# Altium footprint library KEY_PLC1.PcbLib: 123 footprints (part 3 of 8)
Each footprint in its own frame and in the unit in brackets; x right, y up, seen from the top. Pads: shape width x height; smd on the part's side, far side on the other; paste and mask are expansions set on the pad; w line width, h text height; cw(c..) or ccw(c..) is an arc to the next point about the centre after c.
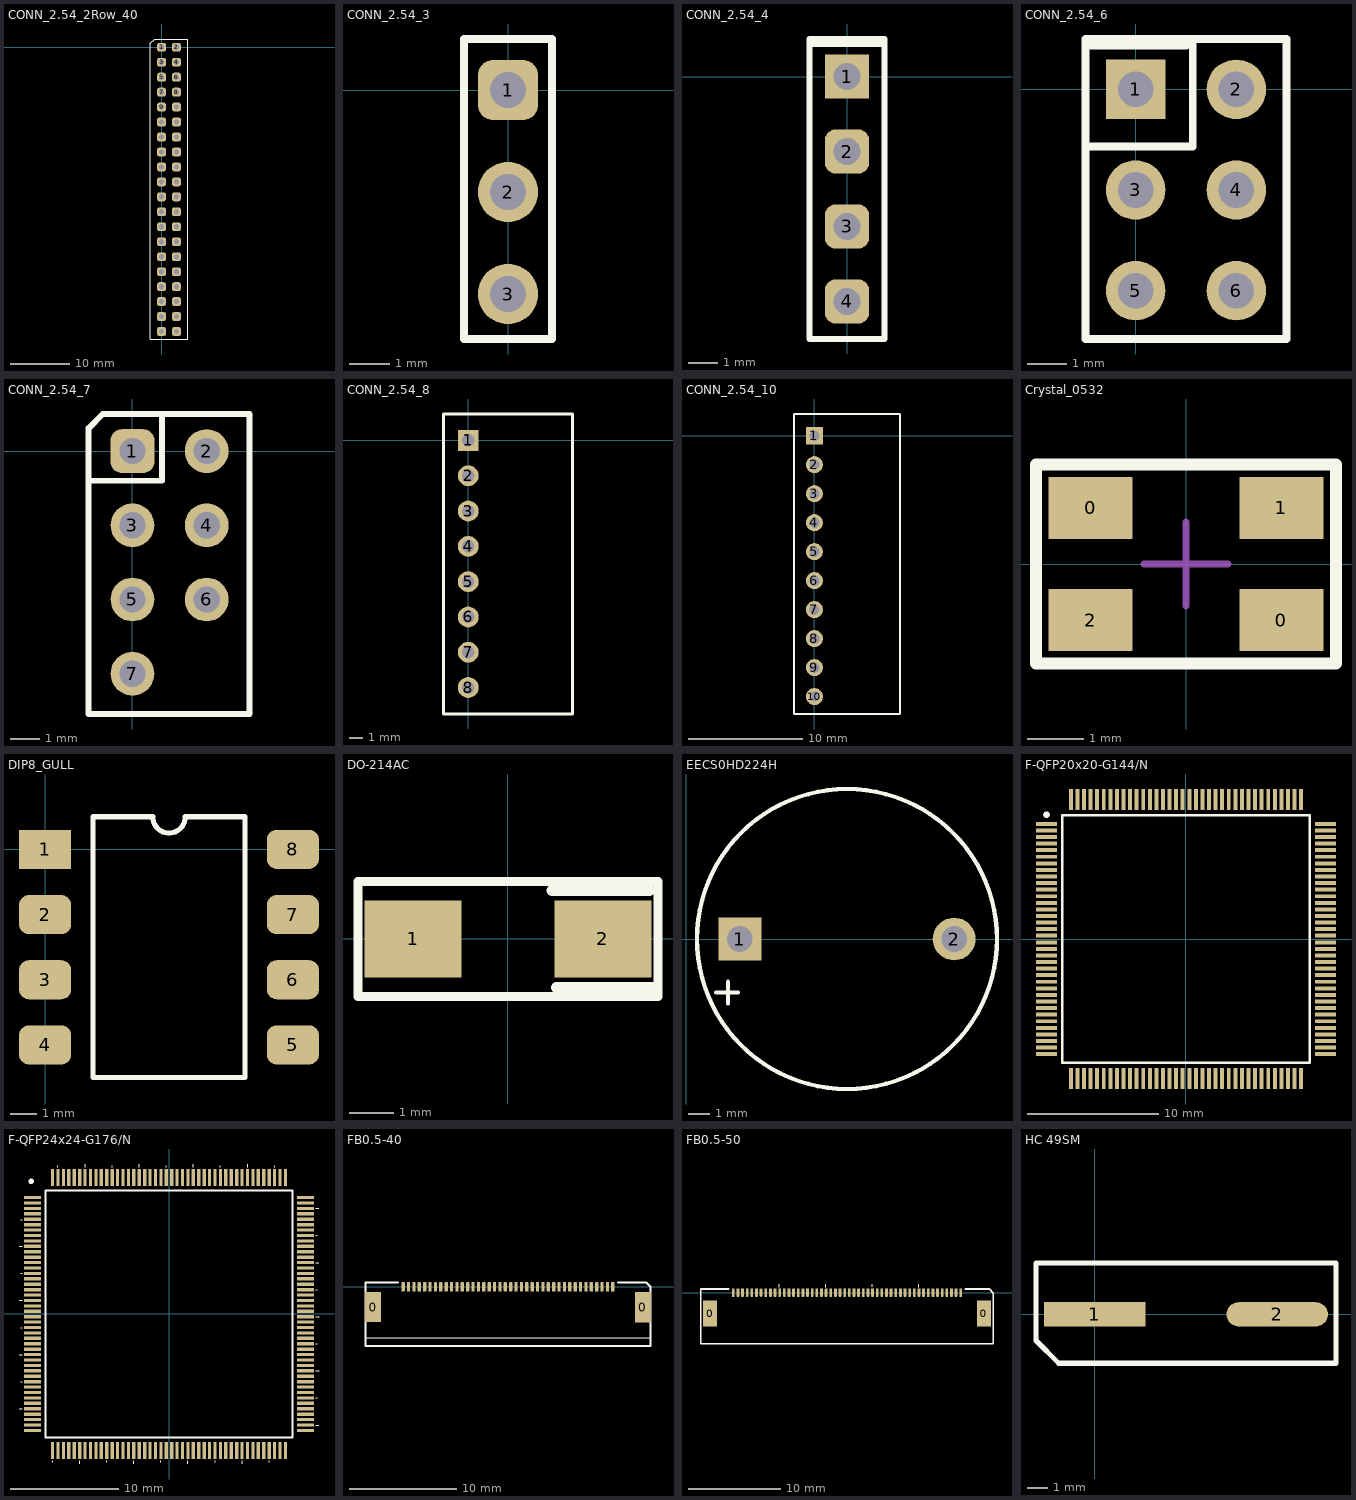
[diagram p2: the footprints below, top view; thin cyan lines are the x and y axes]

## CONN_2.54_2Row_40 [mm]
pads (40):
  rrect50% 1.5x1.5 hole 0.9: 1(0,0) 2(2.54,0) 3(0,-2.54) 4(2.54,-2.54) 5(0,-5.08) 6(2.54,-5.08) 7(0,-7.62) 8(2.54,-7.62) 9(0,-10.16) 10(2.54,-10.16) 11(0,-12.7) 12(2.54,-12.7) 13(0,-15.24) 14(2.54,-15.24) 15(0,-17.78) 16(2.54,-17.78) 17(0,-20.32) 18(2.54,-20.32) 19(0,-22.86) 20(2.54,-22.86) 21(0,-25.4) 22(2.54,-25.4) 23(0,-27.94) 24(2.54,-27.94) 25(0,-30.48) 26(2.54,-30.48) 27(0,-33.02) 28(2.54,-33.02) 29(0,-35.56) 30(2.54,-35.56) 31(0,-38.1) 32(2.54,-38.1) 33(0,-40.64) 34(2.54,-40.64) 35(0,-43.18) 36(2.54,-43.18) 37(0,-45.72) 38(2.54,-45.72) 39(0,-48.26) 40(2.54,-48.26)
Top Overlay:
  lines w0.2: -1.905,-49.53 -1.905,0.635 -1.143,1.397 4.445,1.397 4.445,-8.89 4.445,-49.53 1.27,-49.53 -1.905,-49.53

## CONN_2.54_3 [mm]
pads (3):
  rrect50% 1.5x1.5 hole 0.9: 1(0,0)
  round 1.5 hole 0.9: 2(0,-2.54) 3(0,-5.08)
Top Overlay:
  lines w0.2: -1.1,-6.2 1.1,-6.2 1.1,1.27 -1.1,1.27 -1.1,-6.2

## CONN_2.54_4 [mm]
pads (4):
  rect 1.5x1.5 hole 0.9: 1(0,0)
  rrect50% 1.5x1.5 hole 0.9: 2(0,-2.54) 3(0,-5.08) 4(0,-7.62)
Top Overlay:
  lines w0.2: -1.27,1.1 1.27,1.1 ; -1.27,-8.89 1.27,-8.89 1.27,1.27 -1.27,1.27 -1.27,-8.89

## CONN_2.54_6 [mm]
pads (6):
  rect 1.5x1.5 hole 0.9: 1(0,0)
  round 1.5 hole 0.9: 2(2.54,0) 3(0,-2.54) 4(2.54,-2.54) 5(0,-5.08) 6(2.54,-5.08)
Top Overlay:
  lines w0.2: -1.27,-1.44 1.44,-1.44 1.44,1.27 ; -1.27,1.1 1.27,1.1 ; -1.27,-6.3 3.81,-6.3 3.81,1.27 -1.27,1.27 -1.27,-6.3

## CONN_2.54_7 [mm]
pads (7):
  rrect50% 1.5x1.5 hole 0.9: 1(0,0)
  round 1.5 hole 0.9: 2(2.54,0) 3(0,-2.54) 4(2.54,-2.54) 5(0,-5.08) 6(2.54,-5.08) 7(0,-7.62)
Top Overlay:
  lines w0.2: -1.5,-1.016 1.016,-1.016 1.016,1.27 ; -1.5,-9 -1.5,0.786 -1.016,1.27 4,1.27 4,-9 -1.5,-9

## CONN_2.54_8 [mm]
pads (8):
  rect 1.5x1.5 hole 0.9: 1(0,0)
  round 1.5 hole 0.9: 2(0,-2.54) 3(0,-5.08) 4(0,-7.62) 5(0,-10.16) 6(0,-12.7) 7(0,-15.24) 8(0,-17.78)
Top Overlay:
  lines w0.2: -1.778,-19.685 -1.778,1.905 7.493,1.905 7.493,-19.685 -1.778,-19.685

## CONN_2.54_10 [mm]
pads (10):
  rect 1.5x1.5 hole 0.9: 1(0,0)
  round 1.5 hole 0.9: 2(0,-2.54) 3(0,-5.08) 4(0,-7.62) 5(0,-10.16) 6(0,-12.7) 7(0,-15.24) 8(0,-17.78) 9(0,-20.32) 10(0,-22.86)
Top Overlay:
  lines w0.2: -1.778,-24.384 7.493,-24.384 7.493,1.905 -1.778,1.905 -1.778,-24.384

## Crystal_0532 [mm]
height 1.5
pads (4):
  rect 1.5x1.1 smd: 0(-1.7,1) 0(1.7,-1) 1(1.7,1) 2(-1.7,-1)
Top Overlay:
  lines w0.22: -2.675,-1.775 2.675,-1.775 2.675,1.775 -2.675,1.775 -2.675,-1.775
Mechanical 13:
  lines w0.127: -0.75,0 0,0 ; 0,-0.75 0,0 ; 0,0.75 0,0 ; 0.75,0 0,0 ; -2.65,-1.75 2.65,-1.75 2.65,1.75 -2.65,1.75 -2.65,-1.75
3D body "CRYSTALSMD5X32.STEP": height 1, standoff 0, extent -2.5,-1.6 2.5,1.6

## DIP8_GULL [mm]
pads (8):
  rect 2x1.5 smd: 1(0,0)
  rrect50% 2x1.5 smd: 2(0,-2.5) 3(0,-5) 4(0,-7.5) 5(9.5,-7.5) 6(9.5,-5) 7(9.5,-2.5) 8(9.5,0)
Top Overlay:
  lines w0.2: 1.835,-8.75 1.835,1.25 4.125,1.25 ccw(c4.75,1.25) 5.375,1.25 7.665,1.25 7.665,-8.75 1.835,-8.75
3D body "User Library-8-pin-DIP_GW_HCPL-4200-300E.step": height 4.3, standoff -0.03, extent -0.225,-8.675 9.675,1.225

## DO-214AC [mm]
pads (2):
  rect 2.2x1.75 smd: 1(-2.15,0) 2(2.15,0)
Top Overlay:
  lines w0.2: -3.4,-1.3 3.4,-1.3 3.4,-0.75 3.4,0.35 3.4,1.3 -3.4,1.3 -3.4,-1.3
  lines w0.254: 1,1.1 3.2,1.1 ; 1.1,-1.1 3.3,-1.1
3D body "User Library-DO-214AC_SMA.step": height 2.2, standoff 0, extent -2.5,-1.35 2.5,1.35

## EECS0HD224H [mm]
height 8
pads (2):
  rect 2x2 hole 1.2: 1(2.5,0)
  round 2 hole 1.2: 2(12.5,0)
Top Overlay:
  circle w0.2: c7.5,0 r7
  lines w0.2: 1.4,-2.5 2.416,-2.5 ; 1.95,-3.008 1.95,-1.992
3D body "iONISTER.stp": height 5.78, standoff 0, extent 2.576,-5 12.424,5

## F-QFP20x20-G144/N [mm] "144-Pin Plastic Quad Flat Pack (TQFP)"
height 1.6
pads (144):
  rect 1.6x0.3 smd: 1(-10.6,8.75) 2(-10.6,8.25) 3(-10.6,7.75) 4(-10.6,7.25) 5(-10.6,6.75) 6(-10.6,6.25) 7(-10.6,5.75) 8(-10.6,5.25) 9(-10.6,4.75) 10(-10.6,4.25) 11(-10.6,3.75) 12(-10.6,3.25) 13(-10.6,2.75) 14(-10.6,2.25) 15(-10.6,1.75) 16(-10.6,1.25) 17(-10.6,0.75) 18(-10.6,0.25) 19(-10.6,-0.25) 20(-10.6,-0.75) 21(-10.6,-1.25) 22(-10.6,-1.75) 23(-10.6,-2.25) 24(-10.6,-2.75) 25(-10.6,-3.25) 26(-10.6,-3.75) 27(-10.6,-4.25) 28(-10.6,-4.75) 29(-10.6,-5.25) 30(-10.6,-5.75) 31(-10.6,-6.25) 32(-10.6,-6.75) 33(-10.6,-7.25) 34(-10.6,-7.75) 35(-10.6,-8.25) 36(-10.6,-8.75) 73(10.6,-8.75) 74(10.6,-8.25) 75(10.6,-7.75) 76(10.6,-7.25) 77(10.6,-6.75) 78(10.6,-6.25) 79(10.6,-5.75) 80(10.6,-5.25) 81(10.6,-4.75) 82(10.6,-4.25) 83(10.6,-3.75) 84(10.6,-3.25) 85(10.6,-2.75) 86(10.6,-2.25) 87(10.6,-1.75) 88(10.6,-1.25) 89(10.6,-0.75) 90(10.6,-0.25) 91(10.6,0.25) 92(10.6,0.75) 93(10.6,1.25) 94(10.6,1.75) 95(10.6,2.25) 96(10.6,2.75) 97(10.6,3.25) 98(10.6,3.75) 99(10.6,4.25) 100(10.6,4.75) 101(10.6,5.25) 102(10.6,5.75) 103(10.6,6.25) 104(10.6,6.75) 105(10.6,7.25) 106(10.6,7.75) 107(10.6,8.25) 108(10.6,8.75)
  rect 0.3x1.6 smd: 37(-8.75,-10.6) 38(-8.25,-10.6) 39(-7.75,-10.6) 40(-7.25,-10.6) 41(-6.75,-10.6) 42(-6.25,-10.6) 43(-5.75,-10.6) 44(-5.25,-10.6) 45(-4.75,-10.6) 46(-4.25,-10.6) 47(-3.75,-10.6) 48(-3.25,-10.6) 49(-2.75,-10.6) 50(-2.25,-10.6) 51(-1.75,-10.6) 52(-1.25,-10.6) 53(-0.75,-10.6) 54(-0.25,-10.6) 55(0.25,-10.6) 56(0.75,-10.6) 57(1.25,-10.6) 58(1.75,-10.6) 59(2.25,-10.6) 60(2.75,-10.6) 61(3.25,-10.6) 62(3.75,-10.6) 63(4.25,-10.6) 64(4.75,-10.6) 65(5.25,-10.6) 66(5.75,-10.6) 67(6.25,-10.6) 68(6.75,-10.6) 69(7.25,-10.6) 70(7.75,-10.6) 71(8.25,-10.6) 72(8.75,-10.6) 109(8.75,10.6) 110(8.25,10.6) 111(7.75,10.6) 112(7.25,10.6) 113(6.75,10.6) 114(6.25,10.6) 115(5.75,10.6) 116(5.25,10.6) 117(4.75,10.6) 118(4.25,10.6) 119(3.75,10.6) 120(3.25,10.6) 121(2.75,10.6) 122(2.25,10.6) 123(1.75,10.6) 124(1.25,10.6) 125(0.75,10.6) 126(0.25,10.6) 127(-0.25,10.6) 128(-0.75,10.6) 129(-1.25,10.6) 130(-1.75,10.6) 131(-2.25,10.6) 132(-2.75,10.6) 133(-3.25,10.6) 134(-3.75,10.6) 135(-4.25,10.6) 136(-4.75,10.6) 137(-5.25,10.6) 138(-5.75,10.6) 139(-6.25,10.6) 140(-6.75,10.6) 141(-7.25,10.6) 142(-7.75,10.6) 143(-8.25,10.6) 144(-8.75,10.6)
Top Overlay:
  circle w0.25: c-10.6,9.45 r0.125
  lines w0.2: -9.4,-9.4 9.4,-9.4 9.4,9.4 -9.4,9.4 -9.4,-9.4

## F-QFP24x24-G176/N [mm] "176-Pin Plastic Quad Flat Pack (TQFP)"
height 1.6
pads (176):
  rect 1.6x0.3 smd: 1(-12.6,10.75) 2(-12.6,10.25) 3(-12.6,9.75) 4(-12.6,9.25) 5(-12.6,8.75) 6(-12.6,8.25) 7(-12.6,7.75) 8(-12.6,7.25) 9(-12.6,6.75) 10(-12.6,6.25) 11(-12.6,5.75) 12(-12.6,5.25) 13(-12.6,4.75) 14(-12.6,4.25) 15(-12.6,3.75) 16(-12.6,3.25) 17(-12.6,2.75) 18(-12.6,2.25) 19(-12.6,1.75) 20(-12.6,1.25) 21(-12.6,0.75) 22(-12.6,0.25) 23(-12.6,-0.25) 24(-12.6,-0.75) 25(-12.6,-1.25) 26(-12.6,-1.75) 27(-12.6,-2.25) 28(-12.6,-2.75) 29(-12.6,-3.25) 30(-12.6,-3.75) 31(-12.6,-4.25) 32(-12.6,-4.75) 33(-12.6,-5.25) 34(-12.6,-5.75) 35(-12.6,-6.25) 36(-12.6,-6.75) 37(-12.6,-7.25) 38(-12.6,-7.75) 39(-12.6,-8.25) 40(-12.6,-8.75) 41(-12.6,-9.25) 42(-12.6,-9.75) 43(-12.6,-10.25) 44(-12.6,-10.75) 89(12.6,-10.75) 90(12.6,-10.25) 91(12.6,-9.75) 92(12.6,-9.25) 93(12.6,-8.75) 94(12.6,-8.25) 95(12.6,-7.75) 96(12.6,-7.25) 97(12.6,-6.75) 98(12.6,-6.25) 99(12.6,-5.75) 100(12.6,-5.25) 101(12.6,-4.75) 102(12.6,-4.25) 103(12.6,-3.75) 104(12.6,-3.25) 105(12.6,-2.75) 106(12.6,-2.25) 107(12.6,-1.75) 108(12.6,-1.25) 109(12.6,-0.75) 110(12.6,-0.25) 111(12.6,0.25) 112(12.6,0.75) 113(12.6,1.25) 114(12.6,1.75) 115(12.6,2.25) 116(12.6,2.75) 117(12.6,3.25) 118(12.6,3.75) 119(12.6,4.25) 120(12.6,4.75) 121(12.6,5.25) 122(12.6,5.75) 123(12.6,6.25) 124(12.6,6.75) 125(12.6,7.25) 126(12.6,7.75) 127(12.6,8.25) 128(12.6,8.75) 129(12.6,9.25) 130(12.6,9.75) 131(12.6,10.25) 132(12.6,10.75)
  rect 0.3x1.6 smd: 45(-10.75,-12.6) 46(-10.25,-12.6) 47(-9.75,-12.6) 48(-9.25,-12.6) 49(-8.75,-12.6) 50(-8.25,-12.6) 51(-7.75,-12.6) 52(-7.25,-12.6) 53(-6.75,-12.6) 54(-6.25,-12.6) 55(-5.75,-12.6) 56(-5.25,-12.6) 57(-4.75,-12.6) 58(-4.25,-12.6) 59(-3.75,-12.6) 60(-3.25,-12.6) 61(-2.75,-12.6) 62(-2.25,-12.6) 63(-1.75,-12.6) 64(-1.25,-12.6) 65(-0.75,-12.6) 66(-0.25,-12.6) 67(0.25,-12.6) 68(0.75,-12.6) 69(1.25,-12.6) 70(1.75,-12.6) 71(2.25,-12.6) 72(2.75,-12.6) 73(3.25,-12.6) 74(3.75,-12.6) 75(4.25,-12.6) 76(4.75,-12.6) 77(5.25,-12.6) 78(5.75,-12.6) 79(6.25,-12.6) 80(6.75,-12.6) 81(7.25,-12.6) 82(7.75,-12.6) 83(8.25,-12.6) 84(8.75,-12.6) 85(9.25,-12.6) 86(9.75,-12.6) 87(10.25,-12.6) 88(10.75,-12.6) 133(10.75,12.6) 134(10.25,12.6) 135(9.75,12.6) 136(9.25,12.6) 137(8.75,12.6) 138(8.25,12.6) 139(7.75,12.6) 140(7.25,12.6) 141(6.75,12.6) 142(6.25,12.6) 143(5.75,12.6) 144(5.25,12.6) 145(4.75,12.6) 146(4.25,12.6) 147(3.75,12.6) 148(3.25,12.6) 149(2.75,12.6) 150(2.25,12.6) 151(1.75,12.6) 152(1.25,12.6) 153(0.75,12.6) 154(0.25,12.6) 155(-0.25,12.6) 156(-0.75,12.6) 157(-1.25,12.6) 158(-1.75,12.6) 159(-2.25,12.6) 160(-2.75,12.6) 161(-3.25,12.6) 162(-3.75,12.6) 163(-4.25,12.6) 164(-4.75,12.6) 165(-5.25,12.6) 166(-5.75,12.6) 167(-6.25,12.6) 168(-6.75,12.6) 169(-7.25,12.6) 170(-7.75,12.6) 171(-8.25,12.6) 172(-8.75,12.6) 173(-9.25,12.6) 174(-9.75,12.6) 175(-10.25,12.6) 176(-10.75,12.6)
Top Overlay:
  circle w0.25: c-12.725,12.25 r0.125
  lines w0.1: -13.85,-8.75 -13.55,-8.75 ; -13.85,-3.75 -13.55,-3.75 ; -13.85,1.25 -13.55,1.25 ; -13.85,6.25 -13.55,6.25 ; -13.7,-6.25 -13.55,-6.25 ; -13.7,-1.25 -13.55,-1.25 ; -13.7,3.75 -13.55,3.75 ; -13.7,8.725 -13.55,8.725 ; -10.75,-13.7 -10.75,-13.55 ; -10.25,13.55 -10.25,13.7 ; -8.25,-13.85 -8.25,-13.55 ; -7.75,13.55 -7.75,13.85 ; -5.75,-13.7 -5.75,-13.55 ; -5.25,13.55 -5.25,13.7 ; -3.25,-13.85 -3.25,-13.55 ; -2.75,13.55 -2.75,13.85 ; -0.75,-13.7 -0.75,-13.55 ; -0.25,13.55 -0.25,13.7 ; 1.75,-13.85 1.75,-13.55 ; 2.25,13.55 2.25,13.85 ; 4.25,-13.7 4.25,-13.55 ; 4.75,13.55 4.75,13.7 ; 6.75,-13.85 6.75,-13.55 ; 7.25,13.55 7.25,13.85 ; 9.25,-13.7 9.25,-13.55 ; 9.75,13.55 9.75,13.7 ; 13.55,-10.25 13.85,-10.25 ; 13.55,-7.75 13.7,-7.75 ; 13.55,-5.25 13.85,-5.25 ; 13.55,-2.75 13.7,-2.75 ; 13.55,-0.25 13.85,-0.25 ; 13.55,2.25 13.7,2.25 ; 13.55,4.75 13.85,4.75 ; 13.55,7.25 13.7,7.25 ; 13.55,9.75 13.85,9.75
  lines w0.2: -11.4,-11.4 11.4,-11.4 11.4,11.4 -11.4,11.4 -11.4,-11.4
3D body "User Library-LQFP176-0_5.STEP": height 1.55, standoff -0.02, extent -12.875,-12.897 12.897,12.875

## FB0.5-40 [mm] "FB0.5-40"
pads (42):
  rect 1.5x2.8 smd: 0(8.4,-1.875) 0(33.5,-1.9)
  rect 0.3x0.9 smd: 1(30.7,0)
  rrect50% 0.3x0.9 smd: 2(30.2,0) 3(29.7,0) 4(29.2,0) 5(28.7,0) 6(28.2,0) 7(27.7,0) 8(27.2,0) 9(26.7,0) 10(26.2,0) 11(25.7,0) 12(25.2,0) 13(24.7,0) 14(24.2,0) 15(23.7,0) 16(23.2,0) 17(22.7,0) 18(22.2,0) 19(21.7,0) 20(21.2,0) 21(20.7,0) 22(20.2,0) 23(19.7,0) 24(19.2,0) 25(18.7,0) 26(18.2,0) 27(17.7,0) 28(17.2,0) 29(16.7,0) 30(16.2,0) 31(15.7,0) 32(15.2,0) 33(14.7,0) 35(13.7,0) 36(13.2,0) 37(12.7,0) 38(12.2,0) 39(11.7,0) 40(11.2,0)
  oval 0.3x0.9 smd: 34(14.2,0)
Top Overlay:
  lines w0.1: 7.65,-4.725 34.15,-4.725
  lines w0.2: 7.7,0.3 7.7,-5.5 34.2,-5.5 34.2,0 33.8,0.4 31.2,0.4 ; 7.7,0.4 10.7,0.4
3D body: height 1.97, standoff 0, extent 9.2,-5.3 32.7,-0.4

## FB0.5-50 [mm] "050ZFS-RU-50 type 2"
height 2
pads (52):
  rect 1.5x2.8 smd: 0(8.7,-2.25) 0(38.2,-2.25)
  rect 0.3x0.9 smd: 1(35.7,0)
  rrect50% 0.3x0.9 smd: 2(35.2,0) 3(34.7,0) 4(34.2,0) 5(33.7,0) 6(33.2,0) 7(32.7,0) 8(32.2,0) 9(31.7,0) 10(31.2,0) 11(30.7,0) 12(30.2,0) 13(29.7,0) 14(29.2,0) 15(28.7,0) 16(28.2,0) 17(27.7,0) 18(27.2,0) 19(26.7,0) 20(26.2,0) 21(25.7,0) 22(25.2,0) 23(24.7,0) 24(24.2,0) 25(23.7,0) 26(23.2,0) 27(22.7,0) 28(22.2,0) 29(21.7,0) 30(21.2,0) 31(20.7,0) 32(20.2,0) 33(19.7,0) 34(19.2,0) 35(18.7,0) 36(18.2,0) 37(17.7,0) 38(17.2,0) 39(16.7,0) 40(16.2,0) 41(15.7,0) 42(15.2,0) 43(14.7,0) 45(13.7,0) 46(13.2,0) 47(12.7,0) 48(12.2,0) 49(11.7,0) 50(11.2,0)
  oct 0.3x0.9 smd: 44(14.2,0)
Top Overlay:
  lines w0.1: 16.175,0.6 16.175,0.9 ; 21.175,0.6 21.175,0.9 ; 26.175,0.65 26.175,0.9 ; 31.175,0.6 31.175,0.9
  lines w0.2: 7.7,0.3 7.7,-5.5 39.2,-5.5 39.2,-0.05 38.75,0.4 36.2,0.4 ; 7.7,0.4 10.7,0.4
3D body "541045033.stp": height 2, standoff -0.05, extent 8.2,-6.875 38.7,0.275

## HC 49SM [mm]
pads (2):
  rect 5x1.2 smd: 1(0,0)
  oval 5x1.2 smd: 2(9,0)
Top Overlay:
  lines w0.254: -2.9,-1.291 -1.778,-2.413 8.128,-2.413 11.9,-2.413 11.9,2.54 1.27,2.54 -2.9,2.54 -2.9,-1.291